# Altium footprint library MyPcbLib.PcbLib: 233 footprints (part 2 of 15)
Each footprint in its own frame and in the unit in brackets; x right, y up, seen from the top. Pads: shape width x height; smd on the part's side, far side on the other; paste and mask are expansions set on the pad; w line width, h text height; cw(c..) or ccw(c..) is an arc to the next point about the centre after c.
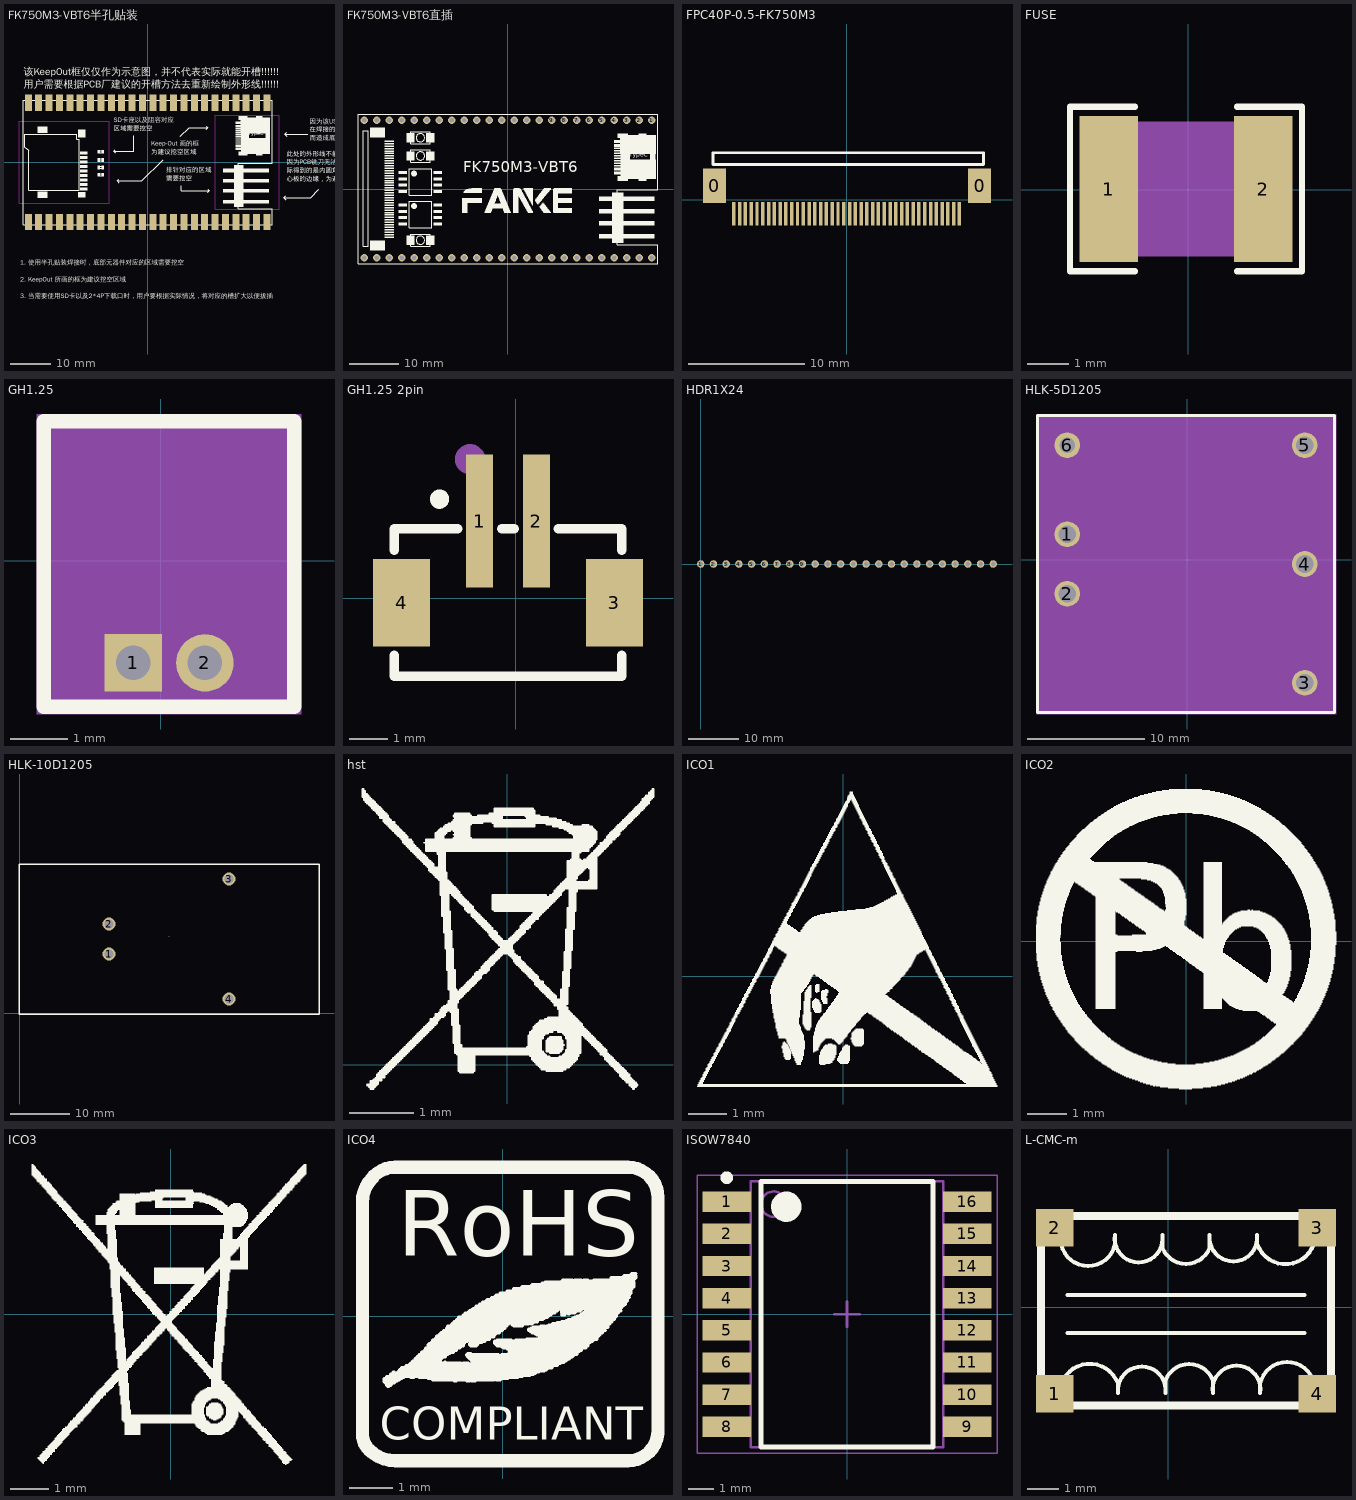
[diagram p1: the footprints below, top view; thin cyan lines are the x and y axes]

## FK750M3-VBT6半孔贴装 [mm]
pads (48):
  rect 1.7x4 smd: 1(29.21,14.605) 2(26.67,14.605) 3(24.13,14.605) 4(21.59,14.605) 5(19.05,14.605) 6(16.51,14.605) 7(13.97,14.605) 8(11.43,14.605) 9(8.89,14.605) 10(6.35,14.605) 11(3.81,14.605) 12(1.27,14.605) 13(-1.27,14.605) 14(-3.81,14.605) 15(-6.35,14.605) 16(-8.89,14.605) 17(-11.43,14.605) 18(-13.97,14.605) 19(-16.51,14.605) 20(-19.05,14.605) 21(-21.59,14.605) 22(-24.13,14.605) 23(-26.67,14.605) 24(-29.21,14.605) 25(29.21,-14.605) 26(26.67,-14.605) 27(24.13,-14.605) 28(21.59,-14.605) 29(19.05,-14.605) 30(16.51,-14.605) 31(13.97,-14.605) 32(11.43,-14.605) 33(8.89,-14.605) 34(6.35,-14.605) 35(3.81,-14.605) 36(1.27,-14.605) 37(-1.27,-14.605) 38(-3.81,-14.605) 39(-6.35,-14.605) 40(-8.89,-14.605) 41(-11.43,-14.605) 42(-13.97,-14.605) 43(-16.51,-14.605) 44(-19.05,-14.605) 45(-21.59,-14.605) 46(-24.13,-14.605) 47(-26.67,-14.605) 48(-29.21,-14.605)
Top Overlay:
  region: -14.694,1.491 -16.51,1.491 -16.51,0.792 -14.694,0.792
  region: -15.215,7.988 -17.005,7.988 -17.005,6.096 -15.215,6.096
  region: -14.694,-2.909 -16.51,-2.909 -16.51,-3.608 -14.694,-3.608
  region: -14.694,-0.709 -16.51,-0.709 -16.51,-1.408 -14.694,-1.408
  region: -14.694,2.591 -16.51,2.591 -16.51,1.892 -14.694,1.892
  region: -14.694,0.391 -16.51,0.391 -16.51,-0.308 -14.694,-0.308
  region: -14.694,-1.809 -16.51,-1.809 -16.51,-2.508 -14.694,-2.508
  region: -14.694,-4.009 -16.51,-4.009 -16.51,-4.708 -14.694,-4.708
  region: -14.694,-6.209 -16.51,-6.209 -16.51,-6.908 -14.694,-6.908
  region: -14.694,-5.109 -16.51,-5.109 -16.51,-5.808 -14.694,-5.808
  region: -15.202,-7.302 -17.005,-7.302 -17.005,-8.611 -15.202,-8.611
  region: -11.684,3.048 -12.319,3.048 -12.319,2.159 -11.684,2.159
  region: -11.671,-0.826 -12.306,-0.826 -12.306,-1.714 -11.671,-1.714
  region: -11.684,-2.616 -12.319,-2.616 -12.319,-3.505 -11.684,-3.505
  region: -11.684,1.003 -12.319,1.003 -12.319,0.114 -11.684,0.114
  region: -24.46,8.738 -26.949,8.738 -26.949,7.15 -24.46,7.15
  region: -24.46,-7.163 -26.949,-7.163 -26.949,-8.738 -24.46,-8.738
  region: -10.668,3.048 -11.303,3.048 -11.303,2.159 -10.668,2.159
  region: -10.655,-0.826 -11.29,-0.826 -11.29,-1.714 -10.655,-1.714
  region: -10.668,-2.616 -11.303,-2.616 -11.303,-3.505 -10.668,-3.505
  region: -10.668,1.003 -11.303,1.003 -11.303,0.114 -10.668,0.114
  rectangle: 18.466,-10.065 29.769,-9.176
  rectangle: 18.466,-7.398 29.769,-6.509
  rectangle: 18.466,-4.985 29.769,-4.096
  rectangle: 18.466,-2.445 29.769,-1.556
  rectangle: 21.133,-10.954 23.419,-0.667
  rectangle: 26.518,10.342 28.143,11.328
  rectangle: 21.539,9.36 22.936,9.995
  rectangle: 21.539,8.572 22.885,9.195
  rectangle: 21.539,3.772 22.885,4.394
  rectangle: 21.539,2.972 22.885,3.594
  rectangle: 21.539,8.09 22.835,8.395
  rectangle: 21.539,7.582 22.835,7.887
  rectangle: 21.539,7.087 22.835,7.391
  rectangle: 21.539,6.591 22.835,6.896
  rectangle: 21.539,6.083 22.835,6.388
  rectangle: 21.539,5.588 22.835,5.893
  rectangle: 21.539,5.08 22.835,5.385
  rectangle: 21.539,4.585 22.835,4.889
  rectangle: 28.804,5.639 29.934,7.391
  rectangle: 26.518,1.651 28.143,2.781
  rectangle: 22.263,1.651 24.397,2.68
  rectangle: 22.263,10.338 24.397,11.328
  rectangle: 22.809,5.766 24.803,7.391
  rectangle: 22.797,7.087 30.023,10.973
  rectangle: 22.809,2.032 30.023,5.956
  lines w0.102: -11.611,-3.284 -11.383,-3.284 ; -11.611,-2.776 -11.383,-2.776 ; -11.611,0.335 -11.383,0.335 ; -11.611,0.843 -11.383,0.843 ; -11.611,2.38 -11.383,2.38 ; -11.611,2.888 -11.383,2.888 ; -11.598,-1.494 -11.37,-1.494 ; -11.598,-0.986 -11.37,-0.986
  lines w0.127: -7.874,2.286 -8.255,2.667 ; -7.874,3.048 -8.255,2.667 ; -3.429,6.477 -3.429,2.667 -8.255,2.667 ; 8.255,-5.715 8.255,-6.985 15.113,-6.985 ; 14.732,-7.366 15.113,-6.985 ; 14.732,-6.604 15.113,-6.985
  lines w0.152: -7.112,-4.953 -7.493,-4.572 ; -7.112,-4.191 -7.493,-4.572 ; 3.81,0.635 -1.397,-4.572 -7.493,-4.572 ; 8.001,6.35 10.16,8.509 14.732,8.509 ; 14.351,8.128 14.732,8.509 ; 14.351,8.89 14.732,8.509 ; 33.598,6.858 34.11,7.37 ; 33.782,-9.144 33.294,-8.656 33.294,-8.616 ; 33.782,-8.128 33.294,-8.616 ; 34.11,6.354 33.606,6.858 39.243,6.858 ; 41.963,-6.608 39.955,-8.616 33.274,-8.616 33.294,-8.616 ; -30.48,-15.24 30.48,-15.24 30.48,-11.358 22.216,-11.358 22.216,-0.182 30.48,-0.182 30.48,15.24 -30.48,15.24 -30.48,-15.24 ; -30.48,-15.24 -30.48,-15.24 ; -30.125,3.647 -30.125,6.847 -17.704,6.847 -17.323,6.847 -17.323,5.704 -16.688,5.704 -16.688,5.069 -16.688,-6.412 -16.688,-6.869 -29.058,-6.869 -29.058,2.91 -30.125,3.647 ; 30.55,6.731 30.558,6.731 30.55,6.731
  text "因为该USB端子的固定引脚是直插的， / 在焊接的时候，可能会因为锡渗入底部 / 而造成底部不平整，所以建议挖空" at 39.677,4.949 h2.03
  text "此处的外形线不能贴着核心板的边线， / 因为PCB铣刀无法加工出内直角，实 / 际得到的是内圆角，加上排针临近核 / 心板的边缘，为避免干涉，需要当拉宽" at 34.089,-5.084 h2.03
  text "1. 使用半孔贴装焊接时，底部元器件对应的区域需要挖空 /  / 2. KeepOut 所画的框为建议挖空区域 /  / 3. 当需要使用SD卡以及2*4P下载口时，用户要根据实际情况，将对应的槽扩大以便拔插" at -31.242,-33.742 h2.03
  text "该KeepOut框仅仅作为示意图，并不代表实际就能开槽!!!!!! / 用户需要根据PCB厂建议的开槽方法去重新绘制外形线!!!!!!" at -30.353,17.629 h3.05
  text "Keep-Out 画的框 / 为建议挖空区域" at 0.889,1.524 h2.03
  text "排针对应的区域 / 需要挖空" at 4.572,-4.953 h2.03
  text "TypeC" at 24.676,6.223 h1.52
  text "SD卡座以及阻容对应 / 区域需要挖空" at -8.255,7.239 h2.03
Keep-Out Layer:
  lines w0.152: -31.496,-10.033 -9.398,-10.033 -9.398,10.033 -31.496,10.033 -31.496,-10.033
  lines w0.203: 16.51,-11.43 32.258,-11.43 32.258,11.557 16.51,11.557 16.51,-11.43
3D body "FK750M3-VBT6-V1.0.step": height 3.86, standoff -2.64, extent -30.48,-15.24 30.48,15.24

## FK750M3-VBT6直插 [mm]
pads (48):
  round 1.5 hole 0.9: 1(29.21,13.97) 2(26.67,13.97) 3(24.13,13.97) 4(21.59,13.97) 5(19.05,13.97) 6(16.51,13.97) 7(13.97,13.97) 8(11.43,13.97) 9(8.89,13.97) 10(6.35,13.97) 11(3.81,13.97) 12(1.27,13.97) 13(-1.27,13.97) 14(-3.81,13.97) 15(-6.35,13.97) 16(-8.89,13.97) 17(-11.43,13.97) 18(-13.97,13.97) 19(-16.51,13.97) 20(-19.05,13.97) 21(-21.59,13.97) 22(-24.13,13.97) 23(-26.67,13.97) 24(-29.21,13.97) 25(29.21,-13.97) 26(26.67,-13.97) 27(24.13,-13.97) 28(21.59,-13.97) 29(19.05,-13.97) 30(16.51,-13.97) 31(13.97,-13.97) 32(11.43,-13.97) 33(8.89,-13.97) 34(6.35,-13.97) 35(3.81,-13.97) 36(1.27,-13.97) 37(-1.27,-13.97) 38(-3.81,-13.97) 39(-6.35,-13.97) 40(-8.89,-13.97) 41(-11.43,-13.97) 42(-13.97,-13.97) 43(-16.51,-13.97) 44(-19.05,-13.97) 45(-21.59,-13.97) 46(-24.13,-13.97) 47(-26.67,-13.97) 48(-29.21,-13.97)
Top Overlay:
  drawing of 913 lines, arcs and shapes, not listed
  text "FK750M3-VBT6" at -9.068,2.553 h3.81
  text "TypeC" at 24.676,6.223 h1.52
3D body "FK750M3-VBT6-V1.0排针.step": height 14.36, standoff 0.26, extent -30.48,-15.24 30.48,15.24

## FPC40P-0.5-FK750M3 [mm]
pads (42):
  rect 2x3 smd: 0(-11.465,1.202) 0(11.465,1.202)
  rect 0.3x2 smd: 1(9.721,-1.202) 2(9.221,-1.202) 3(8.721,-1.202) 4(8.221,-1.202) 5(7.721,-1.202) 6(7.221,-1.202) 7(6.721,-1.202) 8(6.221,-1.202) 9(5.721,-1.202) 10(5.221,-1.202) 11(4.721,-1.202) 12(4.221,-1.202) 13(3.721,-1.202) 14(3.221,-1.202) 15(2.721,-1.202) 16(2.221,-1.202) 17(1.721,-1.202) 18(1.221,-1.202) 19(0.721,-1.202) 20(0.221,-1.202) 21(-0.279,-1.202) 22(-0.779,-1.202) 23(-1.279,-1.202) 24(-1.779,-1.202) 25(-2.279,-1.202) 26(-2.779,-1.202) 27(-3.279,-1.202) 28(-3.779,-1.202) 29(-4.279,-1.202) 30(-4.779,-1.202) 31(-5.279,-1.202) 32(-5.779,-1.202) 33(-6.279,-1.202) 34(-6.779,-1.202) 35(-7.279,-1.202) 36(-7.779,-1.202) 37(-8.279,-1.202) 38(-8.779,-1.202) 39(-9.279,-1.202) 40(-9.779,-1.202)
Top Overlay:
  lines w0.254: -11.585,3.049 -11.585,4.065 11.815,4.065 11.815,3.049 -11.585,3.049
3D body "User Library-FPC-40-2.STEP": height 1.95, standoff 0, extent -12.23,-1.755 12.17,4.545

## FUSE [mm]
pads (2):
  rect 1.407x3.499 smd: 1(-1.913,0.022) 2(1.794,0.022)
Top Overlay:
  lines w0.152: -1.286,-1.956 -2.845,-1.956 -2.845,2.001 -1.286,2.001 ; 1.167,-1.956 2.726,-1.956 2.726,2.001 1.167,2.001
Top Paste:
  region: 1.09,-1.627 1.09,-0.672 1.19,-0.572 1.469,-0.572 1.569,-0.472 1.569,0.517 1.469,0.617 1.19,0.617 1.09,0.717 1.09,1.672 1.19,1.772 2.397,1.772 2.497,1.672 2.497,-1.627 2.397,-1.727 1.19,-1.727
  region: -1.21,-1.627 -1.21,-0.672 -1.31,-0.572 -1.588,-0.572 -1.688,-0.472 -1.688,0.517 -1.588,0.617 -1.31,0.617 -1.21,0.717 -1.21,1.672 -1.31,1.772 -2.516,1.772 -2.616,1.672 -2.616,-1.627 -2.516,-1.727 -1.31,-1.727
Mechanical 4:
  region: -2.335,-1.598 -2.335,1.642 2.215,1.642 2.215,-1.598
Mechanical 5:
  region: -2.335,-1.598 -2.335,1.642 -1.585,1.642 -1.585,-1.598
  region: 2.215,-1.598 2.215,1.642 1.465,1.642 1.465,-1.598
Mechanical 6:
  circle w0.06: c-2.335,-1.598 r0.03
Mechanical 15:
  lines w0.003: -0.085,0.399 -0.034,0.449

## GH1.25 [mm]
pads (2):
  rect 1x1 hole 0.6: 1(-0.482,-1.778)
  round 1 hole 0.6: 2(0.768,-1.778)
Top Overlay:
  lines w0.254: -2.032,-2.54 2.318,-2.54 2.318,2.422 -2.032,2.422 -2.032,-2.54
Mechanical 4:
  region: -2.159,2.549 2.445,2.549 2.445,-2.667 -2.159,-2.667
Mechanical 5:
  region: -0.982,-1.278 0.018,-1.278 0.018,-2.278 -0.982,-2.278
  region: 0.268,-1.278 1.268,-1.278 1.268,-2.278 0.268,-2.278
Mechanical 15:
  lines w0.003: 0.118,0.387 0.168,0.438

## GH1.25 2pin [mm]
pads (4):
  rect 0.7x3.5 smd: 1(-0.955,2.034) 2(0.545,2.034)
  rect 1.5x2.3 smd: 3(2.595,-0.116) 4(-3.005,-0.116)
Top Overlay:
  circle w0.254: c-2.007,2.61 r0.127
  lines w0.254: -3.205,-1.497 -3.205,-2.054 2.795,-2.054 2.795,-1.497 ; -3.205,1.265 -3.205,1.834 -1.536,1.834 ; -0.374,1.834 -0.036,1.834 ; 1.126,1.834 2.794,1.834 2.794,1.265
Mechanical 15:
  circle w0.4: c-1.205,3.659 r0.2

## HDR1X24 [mm] "Connector; Header; 24 Position"
pads (24):
  round 1.5 hole 0.9: 1(0,0) 2(2.54,0) 3(5.08,0) 4(7.62,0) 5(10.16,0) 6(12.7,0) 7(15.24,0) 8(17.78,0) 9(20.32,0) 10(22.86,0) 11(25.4,0) 12(27.94,0) 13(30.48,0) 14(33.02,0) 15(35.56,0) 16(38.1,0) 17(40.64,0) 18(43.18,0) 19(45.72,0) 20(48.26,0) 21(50.8,0) 22(53.34,0) 23(55.88,0) 24(58.42,0)

## HLK-5D1205 [mil]
pads (6):
  round 86.61 hole 59.06: 1(-405,85) 2(-405,-115) 3(395,-415) 4(395,-15) 5(395,385)
  round 86.61 hole 52: 6(-405,385)
Top Overlay:
  lines w10: -505,-515 495,-515 495,485 -505,485 -505,-515
Mechanical 4:
  region: -510,490 500,490 500,-520 -510,-520
Mechanical 5:
  region: -448.31,128.31 -361.69,128.31 -361.69,41.69 -448.31,41.69
  region: -448.31,-71.69 -361.69,-71.69 -361.69,-158.31 -448.31,-158.31
  region: -448.31,428.31 -361.69,428.31 -361.69,341.69 -448.31,341.69
  region: 351.69,428.31 438.31,428.31 438.31,341.69 351.69,341.69
  region: 351.69,-371.69 438.31,-371.69 438.31,-458.31 351.69,-458.31
  region: 351.69,28.31 438.31,28.31 438.31,-58.31 351.69,-58.31
Mechanical 15:
  lines w0.1: -6,2.75 -4,4.75

## HLK-10D1205 [mm]
pads (4):
  round 2.2 hole 1.5: 1(15.113,10.033) 2(15.113,15.113) 3(35.433,22.733) 4(35.433,2.413)
Top Overlay:
  lines w0.254: -0.127,-0.127 -0.127,25.273 50.673,25.273 50.673,-0.127 -0.127,-0.127
Mechanical 15:
  lines w0.003: 25.273,13.049 25.273,13.05

## hst [mm]
Top Overlay:
  drawing of 1279 lines, arcs and shapes, not listed

## ICO1 [mm]
Top Overlay:
  drawing of 990 lines, arcs and shapes, not listed

## ICO2 [mm]
Top Overlay:
  drawing of 960 lines, arcs and shapes, not listed

## ICO3 [mm]
Top Overlay:
  drawing of 1026 lines, arcs and shapes, not listed

## ICO4 [mm]
Top Overlay:
  drawing of 1541 lines, arcs and shapes, not listed
  text "COMPLIANT" at -2.845,-2.869 h0.76
  text "RoHS" at -2.438,1.398 h1.52

## ISOW7840 [mm] "SOIC, 16-Leads, Body 10.30x7.50mm, Pitch 1.27mm, IPC Medium Density"
height 2.65
pads (16):
  rect 1.9x0.8 smd: 1(-4.75,4.445) 2(-4.75,3.175) 3(-4.75,1.905) 4(-4.75,0.635) 5(-4.75,-0.635) 6(-4.75,-1.905) 7(-4.75,-3.175) 8(-4.75,-4.445) 9(4.75,-4.445) 10(4.75,-3.175) 11(4.75,-1.905) 12(4.75,-0.635) 13(4.75,0.635) 14(4.75,1.905) 15(4.75,3.175) 16(4.75,4.445)
Top Overlay:
  circle w0.25: c-4.75,5.395 r0.125
  circle w0.6: c-2.4,4.25 r0.3
  lines w0.2: -3.4,-5.25 -3.4,5.25 3.4,5.25 3.4,-5.25 -3.4,-5.25
Mechanical 2:
  circle w0.1: c-2.9,4.35 r0.5
  lines w0.1: -3.8,-5.25 -3.8,5.25 3.8,5.25 3.8,-5.25 -3.8,-5.25
Mechanical 6:
  lines w0.05: -5.925,-5.5 -5.925,5.5 5.925,5.5 5.925,-5.5 -5.925,-5.5
  lines w0.1: -0.5,0 0.5,0 ; 0,-0.5 0,0.5
3D body: height 2.65, standoff 0.1, extent -3.8,-5.25 3.8,5.25

## L-CMC-m [mil]
pads (4):
  rect 47x47 smd: 1(-141.65,-107.68) 2(-141.65,99.32) 3(185.35,99.32) 4(185.35,-107.68)
Top Overlay:
  lines w5: -133.63,-108.18 -133.63,-95.79 cw(c-98.2,-107.65) -62.76,-95.79 -62.76,-106.61 cw(c-33.24,-103.35) -3.71,-106.61 -3.71,-90.86 ; -133.63,96.82 -133.63,78.41 ccw(c-100.17,85.89) -66.7,78.41 -66.7,90.24 ccw(c-37.17,85.93) -7.65,90.24 -7.65,74.49 ; -125.76,-31.8 169.52,-31.8 ; -125.76,15.44 169.52,15.44 ; -7.63,74.46 ccw(c21.88,85.91) 51.42,74.51 51.41,90.24 ccw(c80.94,86.98) 110.46,90.24 110.46,79.42 ; -3.72,-90.88 cw(c25.82,-102.28) 55.33,-90.83 55.35,-106.61 cw(c84.87,-102.3) 114.4,-106.61 114.4,-94.78 cw(c147.87,-102.26) 181.33,-94.78 181.33,-108.18 ; 110.48,79.38 ccw(c145.9,91.23) 181.34,79.45 ; 181.33,79.42 181.33,96.82
  lines w10: -159.15,-122.18 -159.15,113.82 202.85,113.82 202.85,-122.18 -159.15,-122.18